# Altium footprint library PCB_Module.PcbLib: 19 footprints (part 1 of 2)
Each footprint in its own frame and in the unit in brackets; x right, y up, seen from the top. Pads: shape width x height; smd on the part's side, far side on the other; paste and mask are expansions set on the pad; w line width, h text height; cw(c..) or ccw(c..) is an arc to the next point about the centre after c.
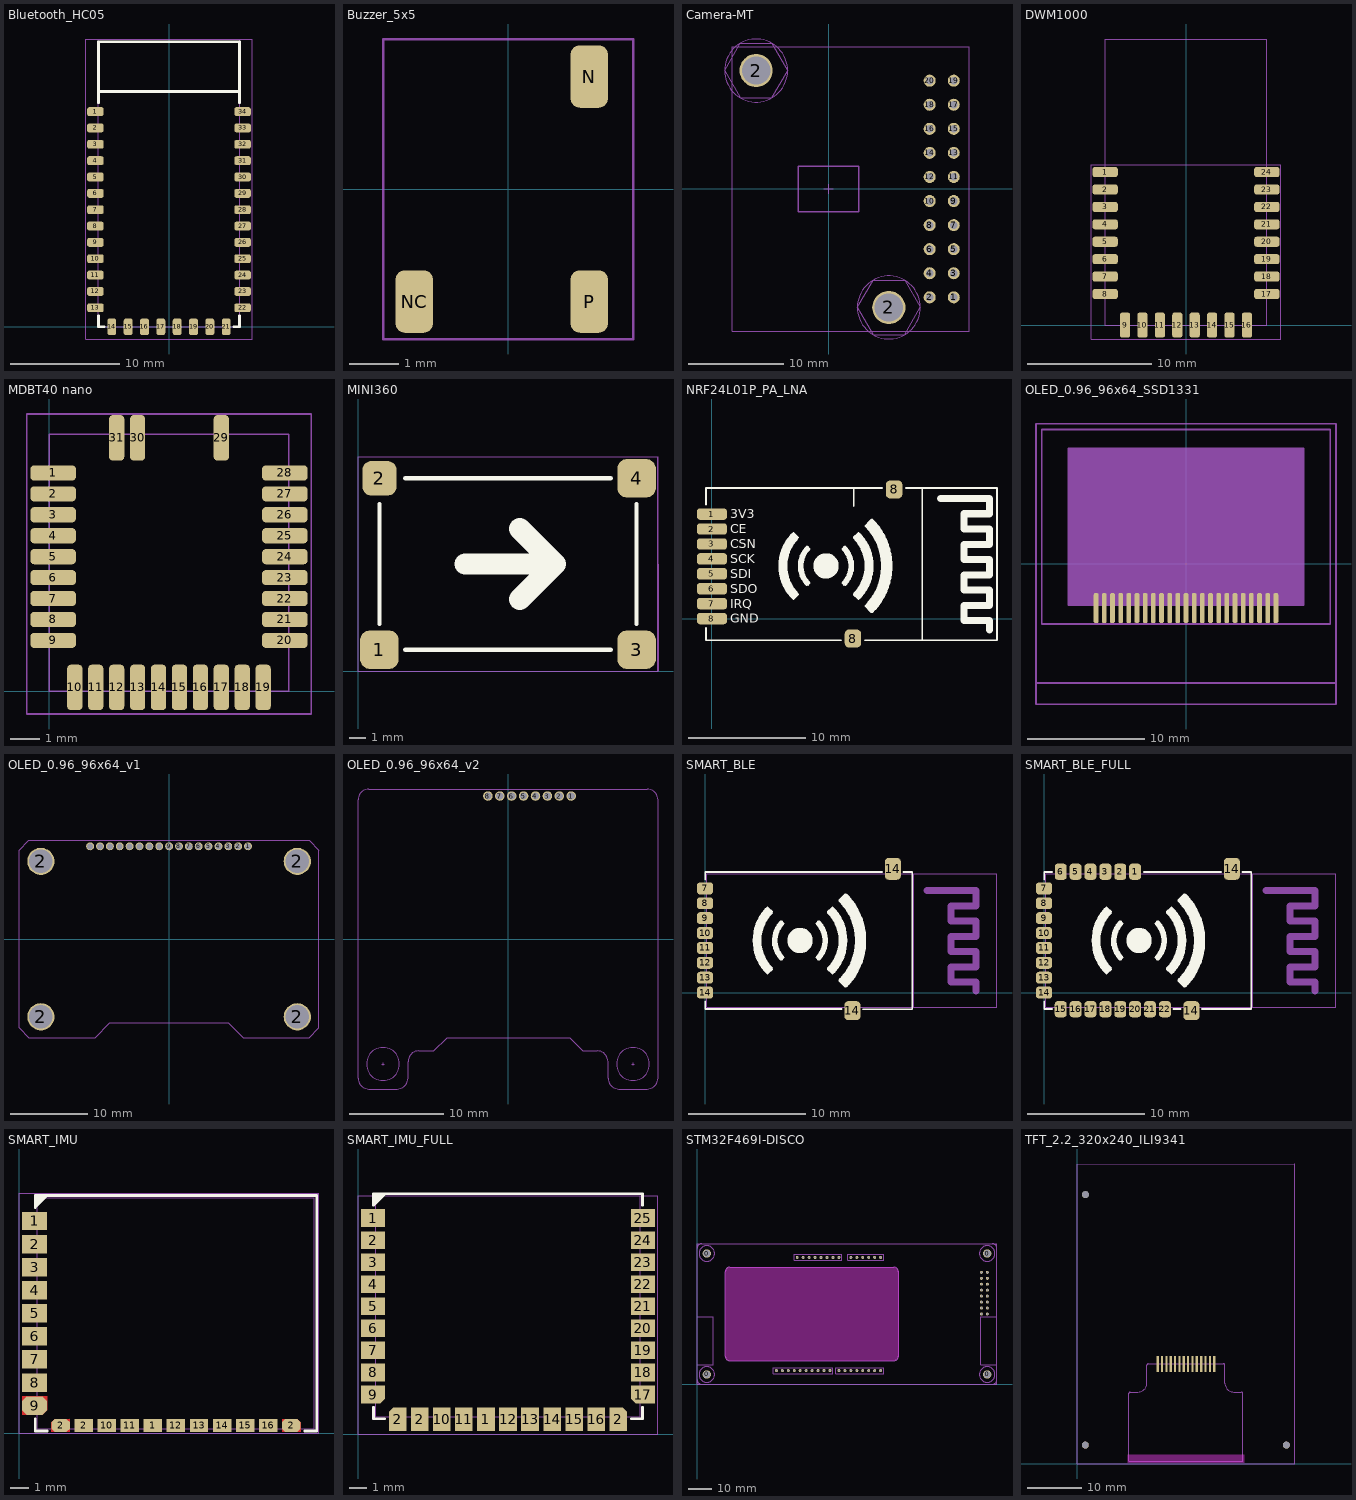
[diagram p0: the footprints below, top view; thin cyan lines are the x and y axes]

## Bluetooth_HC05 [mil]
pads (34):
  rrect50% 60x32 smd: 1(-265.91,777.56) 2(-265.91,718.5) 3(-265.91,659.45) 4(-265.91,600.39) 5(-265.91,541.34) 6(-265.91,482.28) 7(-265.91,423.23) 8(-265.91,364.17) 9(-265.91,305.12) 10(-265.91,246.06) 11(-265.91,187.01) 12(-265.91,127.95) 13(-265.91,68.9) 22(265.91,68.9) 23(265.91,127.95) 24(265.91,187.01) 25(265.91,246.06) 26(265.91,305.12) 27(265.91,364.17) 28(265.91,423.23) 29(265.91,482.28) 30(265.91,541.34) 31(265.91,600.39) 32(265.91,659.45) 33(265.91,718.5) 34(265.91,777.56)
  rrect50% 32x60 smd: 14(-206.69,0) 15(-147.64,0) 16(-88.58,0) 17(-29.53,0) 18(29.53,0) 19(88.58,0) 20(147.64,0) 21(206.69,0)
Top Overlay:
  lines w10: -255,40 -255,0 -235,0 ; -255,810 -255,850 ; 235,0 255,0 255,40 ; 255,810 255,850 ; -255,850 -255,1030 255,1030 255,850 ; -255,850 255,850
Mechanical 13:
  lines w2: -255.91,850.39 255.91,850.39 ; -255.91,0 255.91,0 255.91,1039.37 -255.91,1039.37 -255.91,0
T-Component:
  lines w2: -300,-44 300,-44 300,1040 -300,1040 -300,-44
3D body "User Library-Bluetooth HC-06_.STEP": height 92.52, standoff 0, extent -275.98,0 275.98,1102.76

## Buzzer_5x5 [mil]
pads (3):
  rrect50% 30x50 smd: N(65,90) NC(-75,-90) P(65,-90)
T-Component:
  lines w2: -100,-120 -100,120 100,120 100,-120 -100,-120
3D body "css-0575b-smt.stp": height 106.3, standoff 0, extent -98.44,-98.43 98.41,98.43

## Camera-MT [mil]
pads (22):
  round 50 hole 31: 1(520,-450) 2(420,-450) 3(520,-350) 4(420,-350) 5(520,-250) 6(420,-250) 7(520,-150) 8(420,-150) 9(520,-50) 10(420,-50) 11(520,50) 12(420,50) 13(520,150) 14(420,150) 15(520,250) 16(420,250) 17(520,350) 18(420,350) 19(520,450) 20(420,450)
  round 137.8 hole 118.11 mask+0: 2(-300.94,492.13) 2(250.24,-492.13)
Mechanical 13:
  circle w2: c250.24,-492.13 r130.98
  circle w2: c-300.94,492.13 r130.98
  lines w2: -19.69,0 19.68,0 ; 0,-19.69 0,19.68 ; -431.92,492.13 -366.43,378.7 -235.46,378.7 -169.97,492.12 -235.46,605.55 -366.43,605.55 -431.92,492.13 ; -399.37,-590.55 584.88,-590.55 584.88,590.55 -399.37,590.55 -399.37,-590.55 ; 119.26,-492.13 184.75,-605.56 315.72,-605.56 381.21,-492.13 315.72,-378.7 184.75,-378.7 119.26,-492.13
  lines w6: -126,-94 -126,94 126,94 126,-94 -126,-94
B-Component:
  lines w1: 510,-450 530,-450 ; 510,-350 530,-350 ; 510,-250 530,-250 ; 510,-150 530,-150 ; 510,-50 530,-50 ; 510,50 530,50 ; 510,150 530,150 ; 510,250 530,250 ; 510,350 530,350 ; 510,450 530,450 ; 520,-460 520,-440 ; 520,-360 520,-340 ; 520,-260 520,-240 ; 520,-160 520,-140 ; 520,-60 520,-40 ; 520,40 520,60 ; 520,140 520,160 ; 520,240 520,260 ; 520,340 520,360 ; 520,440 520,460
3D body "female_header_a-bl254-dg-g04d.stp": height 334.65, standoff -125.98, extent 371.57,-504.91 568.42,-295.07
3D body "female_header_a-bl254-dg-g06d.stp": height 334.65, standoff -125.98, extent 371.57,-304.92 568.42,4.93
3D body "female_header_a-bl254-dg-g06d.stp": height 334.65, standoff -125.98, extent 371.57,195.08 568.42,504.93
3D body "female_header_a-bl254-dg-g04d.stp": height 334.65, standoff -125.98, extent 371.57,-4.91 568.42,204.93
3D body "Camera-MT__Pcb.step": height 528.82, standoff 114.65, extent -399.36,-590.55 584.89,590.55

## DWM1000 [mil]
pads (24):
  rrect50% 80x32 smd: 1(-255.91,484.25) 2(-255.91,429.13) 3(-255.91,374.02) 4(-255.91,318.9) 5(-255.91,263.78) 6(-255.91,208.66) 7(-255.91,153.54) 8(-255.91,98.43) 17(255.91,98.43) 18(255.91,153.54) 19(255.91,208.66) 20(255.91,263.78) 21(255.91,318.9) 22(255.91,374.02) 23(255.91,429.13) 24(255.91,484.25)
  rrect50% 32x80 smd: 9(-192.91,0) 10(-137.8,0) 11(-82.68,0) 12(-27.56,0) 13(27.56,0) 14(82.68,0) 15(137.8,0) 16(192.91,0)
Mechanical 13:
  lines w1.97: -255.91,905.51 -255.91,0 255.91,0 255.91,905.51
  lines w2: -255.91,905.51 255.91,905.51
T-Component:
  lines w2: -300,-44 -300,508 300,508 300,-44 -300,-44
3D body "DWM1000 Module.STEP": height 114.17, standoff -0.39, extent -255.9,0 255.9,905.51

## MDBT40 nano [mil]
pads (31):
  rrect50% 60x20 smd: 1(5,287.4) 2(5,259.84) 3(5,232.28) 4(5,204.72) 5(5,177.17) 6(5,149.61) 7(5,122.05) 8(5,94.49) 9(5,66.93) 20(310,66.93) 21(310,94.49) 22(310,122.05) 23(310,149.61) 24(310,177.17) 25(310,204.72) 26(310,232.28) 27(310,259.84) 28(310,287.4)
  rrect50% 20x60 smd: 10(33.46,5) 11(61.02,5) 12(88.58,5) 13(116.14,5) 14(143.7,5) 15(171.26,5) 16(198.82,5) 17(226.38,5) 18(253.94,5) 19(281.5,5) 29(226.38,333.58) 30(116.14,333.58) 31(88.58,333.58)
Mechanical 13:
  lines w2: 0,0 0,338.58 314.96,338.58 314.96,0 0,0
T-Component:
  lines w2: -30,-30 345,-30 345,365 -30,365 -30,-30

## MINI360 [mil]
pads (4):
  rrect50% 90x90 smd: 1(50,50) 3(650,50) 4(650,450)
  rrect50% 80x80 smd: 2(50,450)
Top Overlay:
  lines w10: 50,110 50,390 ; 110,50 590,50 ; 110,450 590,450 ; 650,110 650,390
  lines w50: 250,250 460,250 ; 377.5,167.5 460,250 ; 377.5,332.5 460,250
Mechanical 13:
  lines w2: 0,0 0,500 700,500 700,0 0,0
T-Component:
  lines w2: 0,0 0,500 700,500 700,0 0,0

## NRF24L01P_PA_LNA [mil]
pads (10):
  rrect50% 100x38 smd: 1(0,350) 2(0,300) 3(0,250) 4(0,200) 5(0,150) 6(0,100) 7(0,50) 8(0,0)
  rrect50% 55x60 smd: 8(472.44,-66.93) 8(610.24,432.68)
Top Overlay:
  circle w45: c382,176.4 r20
  lines w6: -20,-31.5 -20,-72.6 433.07,-72.6 ; -20,381.89 -20,437.4 570.87,437.4 ; 474.84,377.4 474.84,437.4 ; 511.81,-72.6 955,-72.6 955,437.4 649.61,437.4 ; 704.92,-72.6 704.92,437.4
  lines w10: 266.5,73.9 273,67.4 287,81.4 282,86.4 ; 267,279.4 273,285.4 287,271.4 282,266.4 ; 314,118.4 319,113.4 325,119.4 320,124.4 ; 314,234.4 319,239.4 325,233.4 320,228.4 ; 444,124.4 439,119.4 445,113.4 450,118.4 ; 444,228.4 439,233.4 445,239.4 450,234.4 ; 482,86.4 477,81.4 491,67.4 497,73.4 ; 482,266.4 477,271.4 491,285.4 497.5,278.9 ; 525.5,51.9 516,42.4 535.5,22.9 545,32.4 ; 526,300.4 516,310.4 535.5,329.9 544.5,320.9
  lines w19: 318.58,120.03 cw(c382,176.4) 318.63,232.84 ; 445.37,119.97 ccw(c382,176.4) 445.42,232.77
  lines w23.62: 765,402.4 929.41,402.4 929.41,351.22 845,351.22 845,300.04 929.41,300.04 929.41,248.86 845,248.86 845,197.68 929.41,197.68 929.41,146.5 845,146.5 845,95.31 929.41,95.31 929.41,44.13 845,44.13 845,-7.05 929.41,-7.05 929.41,-37.6
  lines w30: 272.76,82.2 cw(c382,176.4) 272.76,270.61 ; 491.24,82.2 ccw(c382,176.4) 491.24,270.61
  lines w38: 535.57,42.65 ccw(c382,176.4) 535.57,310.15
  text "GND" at 61,-14.6 h30
  text "IRQ" at 61,35.4 h30
  text "SDO" at 61,85.4 h30
  text "SDI" at 61,135.4 h30
  text "SCK" at 61,185.4 h30
  text "CSN" at 61,235.4 h30
  text "3V3" at 61,335.4 h30
  text "CE" at 61,285.4 h30
3D body "RF.step": height 46.5, standoff -0.8, extent -15,-67.6 950,432.4

## OLED_0.96_96x64_SSD1331 [mil]
pads (23):
  rrect50% 16x100 smd: 1(303.15,-150) 2(275.59,-150) 3(248.03,-150) 4(220.47,-150) 5(192.91,-150) 6(165.35,-150) 7(137.8,-150) 8(110.24,-150) 9(82.68,-150) 10(55.12,-150) 11(27.56,-150) 12(0,-150) 13(-27.56,-150) 14(-55.12,-150) 15(-82.68,-150) 16(-110.24,-150) 17(-137.8,-150) 18(-165.35,-150) 19(-192.91,-150) 20(-220.47,-150) 21(-248.03,-150) 22(-275.59,-150) 23(-303.15,-150)
Mechanical 13:
  region: 396.46,-140 396.46,388.35 -396.46,388.35 -396.46,-140
  lines w6: -505.91,-402.4 -505.91,-474.45 505.91,-474.45 505.91,-402.4 ; -505.91,-402.4 -505.91,471.61 505.91,471.61 505.91,-402.4 ; -505.91,-402.4 505.91,-402.4 ; -486.22,-203.58 -486.22,451.93 486.22,451.93 486.22,-203.58 -486.22,-203.58 ; -396.46,-140 396.46,-140 396.46,388.35 -396.46,388.35 -396.46,-140

## OLED_0.96_96x64_v1 [mil]
pads (21):
  round 40 hole 30: 1(400.45,469.72) 2(350.45,469.72) 3(300.45,469.72) 4(250.45,469.72) 5(200.45,469.72) 6(150.45,469.72) 7(100.45,469.72) 8(50.45,469.72) 9(0.45,469.72) 10(-49.55,469.72) 11(-99.55,469.72) 12(-149.55,469.72) 13(-199.55,469.72) 14(-249.55,469.73) 15(-299.55,469.73) 16(-349.55,469.73) 17(-399.55,469.73)
  round 137.8 hole 118.11 mask+0: 2(-649.15,-393.98) 2(-649.15,393.43) 2(650.06,-393.98) 2(650.06,393.43)
Mechanical 13:
  lines w2: -760,-449.82 -710,-499.82 -374.09,-499.82 -299.55,-425.27 300.45,-425.27 375,-499.82 710,-499.82 760,-449.82 760,450.18 710,500.18 -710,500.18 -760,450.18 -760,-449.82

## OLED_0.96_96x64_v2 [mil]
pads (8):
  round 40 hole 30: 1(265.45,600.55) 2(215.45,600.55) 3(165.45,600.55) 4(115.45,600.55) 5(65.45,600.55) 6(15.45,600.55) 7(-34.55,600.55) 8(-84.55,600.55)
Mechanical 13:
  circle w2: c-525,-525 r69
  circle w2: c525,-525 r69
  lines w2: -530,-525 -520,-525 ; -525,-530 -525,-520 ; 520,-525 530,-525 ; 525,-530 525,-520 ; -630,-585 ccw(c-585,-585) -585,-630 -465,-630 ccw(c-465,-585) -420,-585 -420,-515 cw(c-375,-515) -375,-470 -310.91,-470 -255.45,-414.55 259.55,-414.55 315,-470 375,-470 cw(c375,-515) 420,-515 420,-585 ccw(c465,-585) 465,-630 585,-630 ccw(c585,-585) 630,-585 630,585 ccw(c585,585) 585,630 -585,630 ccw(c-585,585) -630,585 -630,-585
3D body "female_header_a-bl127-eg-z08d.stp": height 133.86, standoff -94.49, extent -117.43,565.11 298.32,635.98

## SMART_BLE [mil]
pads (10):
  rrect50% 54x40 smd: 7(0,350) 8(0,300) 9(0,250) 10(0,200) 11(0,150) 12(0,100) 13(0,50) 14(0,0)
  rrect50% 54x64 smd: 14(495,-61)
  rrect50% 54x74 smd: 14(631,416)
Top Overlay:
  circle w45: c319,175 r20
  lines w6: 1,-29 1,-55 459,-55 ; 1,379 1,405 595,405 ; 531,-56 696,-56 696,405 667,405
  lines w10: 203.5,72.5 210,66 224,80 219,85 ; 204,278 210,284 224,270 219,265 ; 251,117 256,112 262,118 257,123 ; 251,233 256,238 262,232 257,227 ; 381,123 376,118 382,112 387,117 ; 381,227 376,232 382,238 387,233 ; 419,85 414,80 428,66 434,72 ; 419,265 414,270 428,284 434.5,277.5 ; 462.5,50.5 453,41 472.5,21.5 482,31 ; 463,299 453,309 472.5,328.5 482.5,318.5
  lines w19: 255.58,118.63 cw(c319,175) 255.63,231.43 ; 382.37,118.57 ccw(c319,175) 382.42,231.37
  lines w30: 209.76,80.79 cw(c319,175) 209.76,269.21 ; 428.24,80.79 ccw(c319,175) 428.24,269.21
  lines w38: 472.57,41.25 ccw(c319,175) 472.57,308.75
Mechanical 13:
  lines w2: 701,-50 701,400 ; 6,-50 6,400 981,400 981,-50 6,-50
  lines w23.62: 746,342.4 910.41,342.4 910.41,291.22 826,291.22 826,240.04 910.41,240.04 910.41,188.86 826,188.86 826,137.68 910.41,137.68 910.41,86.5 826,86.5 826,35.31 910.41,35.31 910.41,4.76
3D body "SmartBLE_Pcb.step": height 60.16, standoff 3.8, extent 6,-50 981,400

## SMART_BLE_FULL [mil]
pads (24):
  rrect50% 40x54 smd: 1(306,406) 2(256,406) 3(206,406) 4(156,406) 5(106,406) 6(56,406) 15(56,-56) 16(106,-56) 17(156,-56) 18(206,-56) 19(256,-56) 20(306,-56) 21(356,-56) 22(406,-56)
  rrect50% 54x40 smd: 7(0,350) 8(0,300) 9(0,250) 10(0,200) 11(0,150) 12(0,100) 13(0,50) 14(0,0)
  rrect50% 54x64 smd: 14(495,-61)
  rrect50% 54x74 smd: 14(631,416)
Top Overlay:
  circle w45: c319,175 r20
  lines w6: 1,-29 1,-55 27,-55 ; 1,379 1,405 27,405 ; 335,405 595,405 ; 435,-55 459,-55 ; 531,-55 696,-55 696,405 667,405
  lines w10: 203.5,72.5 210,66 224,80 219,85 ; 204,278 210,284 224,270 219,265 ; 251,117 256,112 262,118 257,123 ; 251,233 256,238 262,232 257,227 ; 381,123 376,118 382,112 387,117 ; 381,227 376,232 382,238 387,233 ; 419,85 414,80 428,66 434,72 ; 419,265 414,270 428,284 434.5,277.5 ; 462.5,50.5 453,41 472.5,21.5 482,31 ; 463,299 453,309 472.5,328.5 482.5,318.5
  lines w19: 255.58,118.63 cw(c319,175) 255.63,231.43 ; 382.37,118.57 ccw(c319,175) 382.42,231.37
  lines w30: 209.76,80.79 cw(c319,175) 209.76,269.21 ; 428.24,80.79 ccw(c319,175) 428.24,269.21
  lines w38: 472.57,41.25 ccw(c319,175) 472.57,308.75
Mechanical 13:
  lines w2: 701,-50 701,400 ; 6,-50 981,-50 981,400 6,400 6,-50
  lines w23.62: 746,342.4 910.41,342.4 910.41,291.22 826,291.22 826,240.04 910.41,240.04 910.41,188.86 826,188.86 826,137.68 910.41,137.68 910.41,86.5 826,86.5 826,35.31 910.41,35.31 910.41,4.76
3D body "SmartBLE_Pcb.step": height 60.16, standoff 3.8, extent 6,-50 981,400

## SMART_IMU [mil]
pads (20):
  rect 54x40 smd: 1(34,460) 2(34,410) 3(34,360) 4(34,310) 5(34,260) 6(34,210) 7(34,160) 8(34,110)
  rect 40x28 smd: 1(290,17) 2(140,17) 10(190,17) 11(240,17) 12(340,17) 13(390,17) 14(440,17) 15(490,17) 16(540,17)
  oct 40x28 smd: 2(90,17) 2(590,17)
  oct 54x40 smd: 9(34,60)
Top Layer:
  region: 570,3 570,31 603,31 610,24 610,3
  region: 7,80 61,80 61,50 51,40 7,40
  region: 110,3 70,3 70,24 77,31 110,31
Top Overlay:
  region: 35,515 61,515 35,489
  lines w6: 35,31 35,5 61,5 ; 61,515 35,489 35,515 645,515 645,5 619,5
Mechanical 13:
  lines w2: 40,10 640,10 640,510 40,510 40,10
T-Component:
  lines w2: 0,0 650,0 650,520 0,520 0,0
3D body "SmartIMU_Pcb.step": height 84.06, standoff -0.4, extent 40,10 640.01,510

## SMART_IMU_FULL [mil]
pads (41):
  rect 54x40 smd: 1(34,490) 2(34,440) 3(34,390) 4(34,340) 5(34,290) 6(34,240) 7(34,190) 8(34,140) 18(646,140) 19(646,190) 20(646,240) 21(646,290) 22(646,340) 23(646,390) 24(646,440) 25(646,490)
  rect 40x54 smd: 1(290,34) 2(140,34) 10(190,34) 11(240,34) 12(340,34) 13(390,34) 14(440,34) 15(490,34) 16(540,34)
  rect 10x10 smd: 2(75,12) 2(105,12) 2(105,56) 2(575,12) 2(575,56) 2(605,12) 9(12,75) 9(12,105) 9(56,105) 17(624,105) 17(668,75) 17(668,105)
  oct 40x54 smd: 2(90,34) 2(590,34)
  oct 54x40 smd: 9(34,90) 17(646,90)
Top Overlay:
  region: 35,545 61,545 35,519
  lines w6: 35,61 35,35 61,35 ; 61,545 35,519 35,545 645,545 645,519 ; 619,35 645,35 645,61
Mechanical 13:
  lines w2: 40,40 40,540 640,540 640,40 40,40
T-Component:
  lines w2: 0,0 680,0 680,540 0,540 0,0
3D body "SmartIMU_Pcb.step": height 84.06, standoff -0.4, extent 40,40 640,540

## STM32F469I-DISCO [mm]
pads (52):
  round 3.556 hole 3.048 mask+0: 0(4.19,4.19) 0(4.19,55.81) 0(123.81,4.19) 0(123.81,55.81)
  round 1.27 hole 0.813: 1(42.771,54.13) 2(45.311,54.13) 3(47.851,54.13) 4(50.391,54.13) 5(52.931,54.13) 6(55.471,54.13) 7(58.011,54.13) 8(60.551,54.13) 9(65.631,54.13) 10(68.171,54.13) 11(70.711,54.13) 12(73.251,54.13) 13(75.791,54.13) 14(78.331,54.13) 15(78.331,5.87) 16(75.791,5.87) 17(73.251,5.87) 18(70.711,5.87) 19(68.171,5.87) 20(65.631,5.87) 21(63.091,5.87) 22(60.551,5.87) 23(56.741,5.87) 24(54.201,5.87) 25(51.661,5.87) 26(49.121,5.87) 27(46.581,5.87) 28(44.041,5.87) 29(41.501,5.87) 30(38.961,5.87) 31(36.421,5.87) 32(33.881,5.87) 33(121.345,47.78) 34(123.885,47.78) 35(121.345,45.24) 36(123.885,45.24) 37(121.345,42.7) 38(123.885,42.7) 39(121.345,40.16) 40(123.885,40.16) 41(121.345,37.62) 42(123.885,37.62) 43(121.345,35.08) 44(123.885,35.08) 45(121.345,32.54) 46(123.885,32.54) 47(121.345,30) 48(123.885,30)
Keep-Out Layer:
  board cut-out: 12.065,12.033 12.065,48.038 12.065,48.235 12.142,48.621 12.293,48.985 12.511,49.313 12.79,49.592 13.118,49.81 13.482,49.961 13.868,50.038 14.065,50.038 83.979,50.038 84.176,50.038 84.562,49.961 84.926,49.81 85.254,49.592 85.533,49.313 85.751,48.985 85.902,48.621 85.979,48.235 85.979,48.038 85.979,12.033 85.979,11.836 85.902,11.45 85.751,11.086 85.533,10.758 85.254,10.479 84.926,10.261 84.562,10.11 84.176,10.033 83.979,10.033 14.065,10.033 13.868,10.033 13.482,10.11 13.118,10.261 12.79,10.479 12.511,10.758 12.293,11.086 12.142,11.45 12.065,11.836
Mechanical 13:
  circle w0.051: c4.19,55.81 r3.327
  circle w0.051: c4.19,4.19 r3.327
  circle w0.051: c123.81,4.19 r3.327
  circle w0.051: c123.81,55.81 r3.327
  lines w0.051: 0,2 ccw(c2,2) 2,0 126,0 ccw(c126,2) 128,2 128,8.255 120.964,8.255 120.964,28.829 128,28.829 128,58 ccw(c126,58) 126,60 2,60 ccw(c2,58) 0,58 0,28.829 7.036,28.829 7.036,8.255 0,8.255 0,2 ; 12.065,12.033 ccw(c14.065,12.033) 14.065,10.033 83.979,10.033 ccw(c83.979,12.033) 85.979,12.033 85.979,48.038 ccw(c83.979,48.038) 83.979,50.038 14.065,50.038 ccw(c14.065,48.038) 12.065,48.038 12.065,12.033 ; 32.611,4.6 58.011,4.6 58.011,7.14 32.611,7.14 32.611,4.6 ; 41.501,52.86 41.501,55.4 61.821,55.4 61.821,52.86 41.501,52.86 ; 59.281,4.6 59.281,7.14 79.601,7.14 79.601,4.6 59.281,4.6 ; 64.361,52.86 79.601,52.86 79.601,55.4 64.361,55.4 64.361,52.86
T-Component:
  lines w0.051: 0,0 128,0 128,60 0,60 0,0
3D body "pin_header_aw140-eg-g08d.stp": height 8.2, standoff -3, extent 59.281,4.621 79.601,7.119
3D body "pin_header_aw140-eg-g10d.stp": height 8.2, standoff -3, extent 32.611,4.621 58.011,7.119
3D body "pin_header_aw140-eg-g06d.stp": height 8.2, standoff -3, extent 64.361,52.881 79.601,55.379
3D body "pin_header_aw140-eg-g08d.stp": height 8.2, standoff -3, extent 41.501,52.881 61.821,55.379
3D body "female_header_a-bl254-dg-g16d.stp": height 8.5, standoff -3.2, extent 120.115,28.605 125.115,49.175

## TFT_2.2_320x240_ILI9341 [mil]
pads (17):
  round 50 hole 50 unplated mask+0: 1(59.74,137) 1(60.74,1952) 1(1516.74,137)
  rect 16x118 smd mask+1: 1(993.87,724) 2(962.38,724) 3(930.88,724) 4(899.39,724) 5(867.89,724) 6(836.39,724) 7(804.9,724) 8(773.4,724) 9(741.9,724) 10(710.41,724) 11(678.91,724) 12(647.42,724) 13(615.92,724) 14(584.42,724)
Keep-Out Layer:
  board cut-out: 1212,66.34 1212,8.23 367.78,8.23 367.78,66.34
Mechanical 13:
  lines w2: 0,0 0,2174 1579,2174 1579,0 0,0 ; 376,21.34 1201,21.34 1201,511.34 ccw(c1191,511.34) 1191,521.34 1136,521.34 cw(c1136,586.34) 1071,586.34 1071,716.34 ccw(c1061,716.34) 1061,726.34 516,726.34 ccw(c516,716.34) 506,716.34 506,586.34 cw(c441,586.34) 441,521.34 386,521.34 ccw(c386,511.34) 376,511.34 376,21.34